# Altium footprint library Amirreza.PcbLib: 524 footprints (part 33 of 33)
Each footprint in its own frame and in the unit in brackets; x right, y up, seen from the top. Pads: shape width x height; smd on the part's side, far side on the other; paste and mask are expansions set on the pad; w line width, h text height; cw(c..) or ccw(c..) is an arc to the next point about the centre after c.
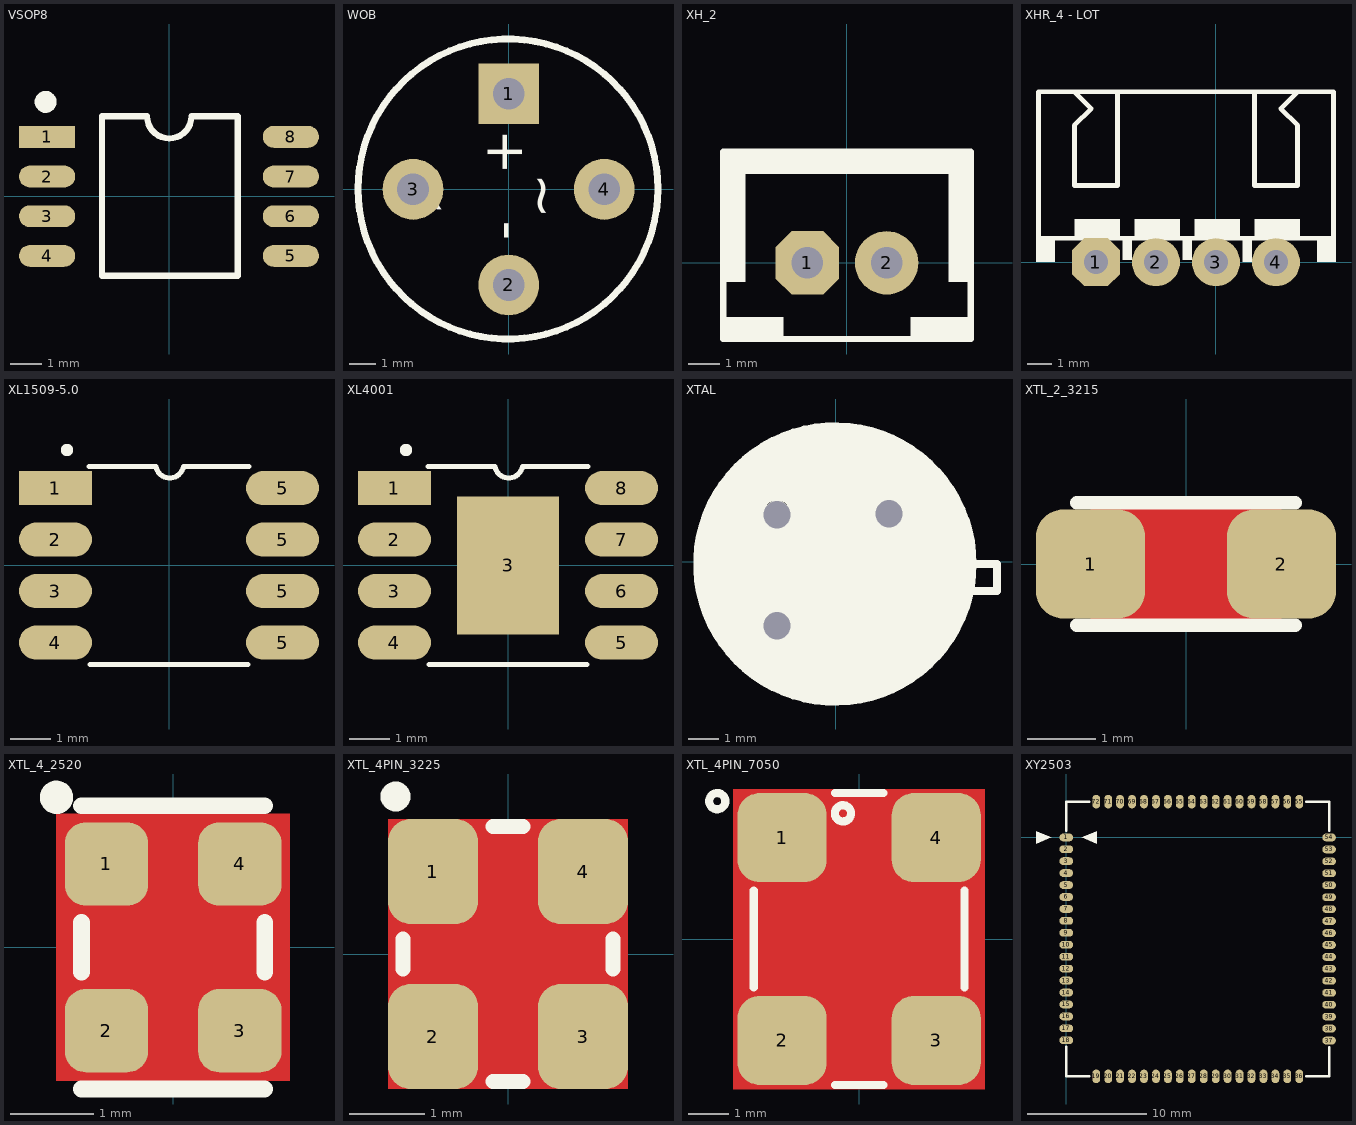
[diagram p32: the footprints below, top view; thin cyan lines are the x and y axes]

## VSOP8 [mm]
pads (8):
  rect 1.8x0.7 smd: 1(-3.9,1.905)
  oval 1.8x0.7 smd: 2(-3.9,0.635) 3(-3.9,-0.635) 4(-3.9,-1.905) 5(3.9,-1.905) 6(3.9,-0.635) 7(3.9,0.635) 8(3.9,1.905)
Top Overlay:
  circle w0.45: c-3.948,3.023 r0.125
  lines w0.2: -0.703,2.561 ccw(c0.008,2.565) 0.718,2.561 ; -0.702,2.565 -2.146,2.565 -2.146,-2.54 2.198,-2.54 2.198,2.565 0.718,2.565
3D body "User Library-VSOP8.STEP": height 1, standoff 0, extent -4.05,-2.69 4.05,2.69

## WOB [mil]
pads (4):
  rect 90x90 hole 47: 1(0,141.42)
  round 90 hole 47: 2(0,-141.42) 3(-141.42,0) 4(141.42,0)
Top Overlay:
  circle w10: c-1.02,0.51 r221.89
  text "+" at -31.02,88.62 h59.06
  text "-" at -26.02,-46.38 h59.05
  text "~" at -131.02,28.62 h59.05
  text "~" at 23.98,23.62 h59.05
3D body "User Library-WOB-1.step": height 220.47, standoff -137.8, extent -258.9,-258.89 258.91,258.92

## XH_2 [mm] "PW10-xx-M, JST-BxB-XH-A pitch: 2.5mm"
height 0.6
pads (2):
  oct 2x2 hole 1: 1(-1.25,0)
  round 2 hole 1: 2(1.25,0)
Top Overlay:
  rectangle: -3.9,-2.4 -2,-1.7
  rectangle: -3.9,-0.6 -3.2,3.5
  region: -3.9,3.5 -3.9,2.8 3.9,2.8 3.9,3.5
  region: 3.9,3.5 3.2,3.5 3.2,-0.6 3.9,-0.6
  region: 3.9,-1.7 2,-1.7 2,-2.4 3.9,-2.4
  lines w0.2: -3.9,-2.4 3.9,-2.4 3.9,3.5 -3.9,3.5 -3.9,-2.4
3D body "User Library-PW10-02-M white.step": height 7, standoff -3.3, extent -3.75,-2.3 3.75,3.4

## XHR_4 - LOT [mm] "JST-SxB-XH-A pitch: 2.5mm"
pads (4):
  oct 2x2 hole 1: 1(-5,0)
  round 2 hole 1: 2(-2.5,0) 3(0,0) 4(2.5,0)
Top Overlay:
  rectangle: -7.5,0 -6.7,1
  region: 5,1 4.2,1 4.2,0 5,0
  rectangle: -3.9,0.1 -3.5,0.9
  rectangle: -1.4,0.1 -1,0.9
  rectangle: 1.1,0 1.5,0.9
  rectangle: -5.9,1 -4,1.8
  rectangle: -3.4,1 -1.5,1.8
  rectangle: -0.9,1 1,1.8
  rectangle: 1.6,1 3.5,1.8
  lines w0.2: -5.9,7.1 -5.2,6.4 -5.9,5.7 ; -4.1,7.1 -4.1,3.2 -5.9,3.2 -5.9,5.7 ; 1.6,7.1 1.6,3.2 3.4,3.2 3.4,5.7 ; 3.4,7.1 2.7,6.4 3.4,5.7 ; -5.9,5.7 -5.9,5.7 ; 3.4,5.7 3.4,5.7 ; -7.4,1 4.9,1 4.9,7.1 -7.4,7.1 -7.4,1
3D body "LOT_JST-XH-2_5mm-4.step": height 5.95, standoff -3.35, extent -7.503,-0.459 4.997,7.181

## XL1509-5.0 [mm]
height 0.55
pads (8):
  rect 1.8x0.838 smd: 1(-2.8,1.905)
  oval 1.8x0.838 smd: 2(-2.8,0.635) 3(-2.8,-0.635) 4(-2.8,-1.905) 5(2.8,-1.905) 5(2.8,-0.635) 5(2.8,0.635) 5(2.8,1.905)
Top Overlay:
  circle w0.254: c-2.515,2.845 r0.025
  lines w0.127: -1.975,2.438 -0.322,2.438 ccw(c0.017,2.498) 0.356,2.438 1.975,2.438 ; -1.95,-2.45 1.95,-2.45
3D body "CircuitWorks-SO-8.STEP": height 1.45, standoff 0, extent -2.889,-2.464 2.889,2.438

## XL4001 [mm]
pads (9):
  rect 1.8x0.838 smd: 1(-2.8,1.905)
  oval 1.8x0.838 smd: 2(-2.8,0.635) 3(-2.8,-0.635) 4(-2.8,-1.905) 5(2.8,-1.905) 6(2.8,-0.635) 7(2.8,0.635) 8(2.8,1.905)
  rect 2.513x3.402 smd: 3(0,0)
Top Overlay:
  circle w0.254: c-2.515,2.845 r0.025
  lines w0.127: -1.975,2.438 -0.322,2.438 ccw(c0.017,2.498) 0.356,2.438 1.975,2.438 ; -1.95,-2.45 1.95,-2.45
3D body "CircuitWorks-SO-8.STEP": height 1.45, standoff 0, extent -2.889,-2.464 2.889,2.438

## XTAL [mil]
pads (6):
  round 0 hole 35.43 unplated: 0(-76,61) 1(69,62) 2(-76,-83)
  round 0 / inner round 98.43 / far side round 98.43 hole 7.87: 1(70,62) 2(-76,61) 3(-76,-83)
Top Overlay:
  drawing of 8 lines, arcs and shapes, not listed

## XTL_2_3215 [mm] "ABS07 3.2x1.5mm"
height 2
pads (2):
  rrect50% 1.6x1.6 smd mask+0.075: 1(-1.4,0) 2(1.4,0)
Top Layer:
  pour cut-out: -1.4,0.8 -1.4,-0.8 1.4,-0.8 1.4,0.8
Top Overlay:
  lines w0.2: -1.6,-0.9 1.6,-0.9 ; -1.6,0.9 1.6,0.9
3D body "User Library-ABS07.STEP": height 0.91, standoff 0, extent -1.61,-0.76 1.61,0.76

## XTL_4_2520 [mm] "CRYSTAL OSCILATOR 2.5X2.0mm, ABM10, CDFN-4, ASDM"
pads (4):
  rrect50% 1x1 smd: 1(-0.8,1) 2(-0.8,-1) 3(0.8,-1) 4(0.8,1)
Top Layer:
  pour cut-out: -1.4,1.6 -1.4,-1.6 1.4,-1.6 1.4,1.6
Top Overlay:
  circle w0.2: c-1.4,1.8 r0.1
  lines w0.2: -1.1,-1.7 1.1,-1.7 ; -1.1,-0.3 -1.1,0.3 ; -1.1,1.7 1.1,1.7 ; 1.1,-0.3 1.1,0.3
Mechanical 13:
  circle w0.1: c-0.2,0.8 r0.3
  lines w0.1: -1,-1.3 1,-1.3 1,1.3 -1,1.3 -1,-1.3
3D body "User Library-SM2520-4.step": height 0.8, standoff -0.03, extent -1,-1.25 1,1.25

## XTL_4PIN_3225 [mm] "CRYSTAL OSCILATOR 3.2X2.5mm, ABM8, CDFN-4"
pads (4):
  rrect50% 1.2x1.4 smd: 1(-1,1.1) 2(-1,-1.1) 3(1,-1.1) 4(1,1.1)
Top Layer:
  pour cut-out: -1.6,1.8 -1.6,-1.8 1.6,-1.8 1.6,1.8
Top Overlay:
  circle w0.2: c-1.5,2.1 r0.1
  lines w0.2: -1.4,-0.2 -1.4,0.2 ; -0.2,-1.7 0.2,-1.7 ; -0.2,1.7 0.2,1.7 ; 1.4,-0.2 1.4,0.2
Mechanical 13:
  circle w0.1: c-0.8,1.1 r0.3
  lines w0.1: -1.3,-1.6 -1.3,1.6 1.3,1.6 1.3,-1.6 -1.3,-1.6
3D body "User Library-3225-1.step": height 0.61, standoff 0, extent -1.25,-1.6 1.25,1.6

## XTL_4PIN_7050 [mm] "DFN-4, 7x5mm"
pads (4):
  rrect50% 2.2x2.2 smd: 1(-1.9,2.5) 2(-1.9,-2.5) 3(1.9,-2.5) 4(1.9,2.5)
Top Layer:
  pour cut-out: -3.1,3.7 -3.1,-3.7 3.1,-3.7 3.1,3.7
Top Overlay:
  circle w0.2: c-3.5,3.4 r0.2
  circle w0.2: c-0.4,3.1 r0.2
  lines w0.2: -2.6,-1.2 -2.6,1.2 ; -0.6,-3.6 0.6,-3.6 ; -0.6,3.6 0.6,3.6 ; 2.6,-1.2 2.6,1.2
Mechanical 13:
  circle w0.1: c-1.9,2.9 r0.3
  lines w0.1: -2.5,-3.5 -2.5,3.5 2.5,3.5 2.5,-3.5 -2.5,-3.5
3D body "User Library-CTS-CB3_7x5.step": height 1.71, standoff 0, extent -2.5,-3.5 2.5,3.5

## XY2503 [mm]
pads (72):
  oval 1.15x0.65 smd mask+0.102: 1(0,0) 2(0,-0.981) 3(0,-1.981) 4(0,-2.981) 5(0,-3.981) 6(0,-4.981) 7(0,-5.981) 8(0,-6.981) 9(0,-7.981) 10(0,-8.981) 11(0,-9.981) 12(0,-10.981) 13(0,-11.981) 14(0,-12.981) 15(0,-13.981) 16(0,-14.981) 17(0,-15.981) 18(0,-16.981) 37(22,-17) 38(22,-16) 39(22,-15) 40(22,-14) 41(22,-13) 42(22,-12) 43(22,-11) 44(22,-10) 45(22,-9) 46(22,-8) 47(22,-7) 48(22,-6) 49(22,-5) 50(22,-4) 51(22,-3) 52(22,-2) 53(22,-1) 54(22,0)
  oval 0.65x1.15 smd mask+0.102: 19(2.5,-20) 20(3.5,-20) 21(4.5,-20) 22(5.5,-20) 23(6.5,-20) 24(7.5,-20) 25(8.5,-20) 26(9.5,-20) 27(10.5,-20) 28(11.5,-20) 29(12.5,-20) 30(13.5,-20) 31(14.5,-20) 32(15.5,-20) 33(16.5,-20) 34(17.5,-20) 35(18.5,-20) 36(19.5,-20) 55(19.5,3) 56(18.5,3) 57(17.5,3) 58(16.5,3) 59(15.5,3) 60(14.5,3) 61(13.5,3) 62(12.5,3) 63(11.5,3) 64(10.5,3) 65(9.5,3) 66(8.5,3) 67(7.5,3) 68(6.5,3) 69(5.5,3) 70(4.5,3) 71(3.5,3) 72(2.5,3)
Top Overlay:
  region: 2.54,-0.508 2.54,0 1.27,0
  region: 2.54,0.508 2.54,0 1.27,0
  region: -2.54,-0.508 -2.54,0 -1.27,0
  region: -2.54,0.508 -2.54,0 -1.27,0
  lines w0.203: 0,-20 1.928,-20 ; 0,-19.981 0,-17.525 ; 0,0.544 0,3 1.928,3 ; 20.072,-20 22,-20 22,-17.544 ; 20.072,3 22,3 22,0.544